# Altium schematic symbol library MCU_Microchip_ATmega.SchLib: 440 symbols (part 7 of 9) (continued)
## ATxmega16A4U-M (continued)
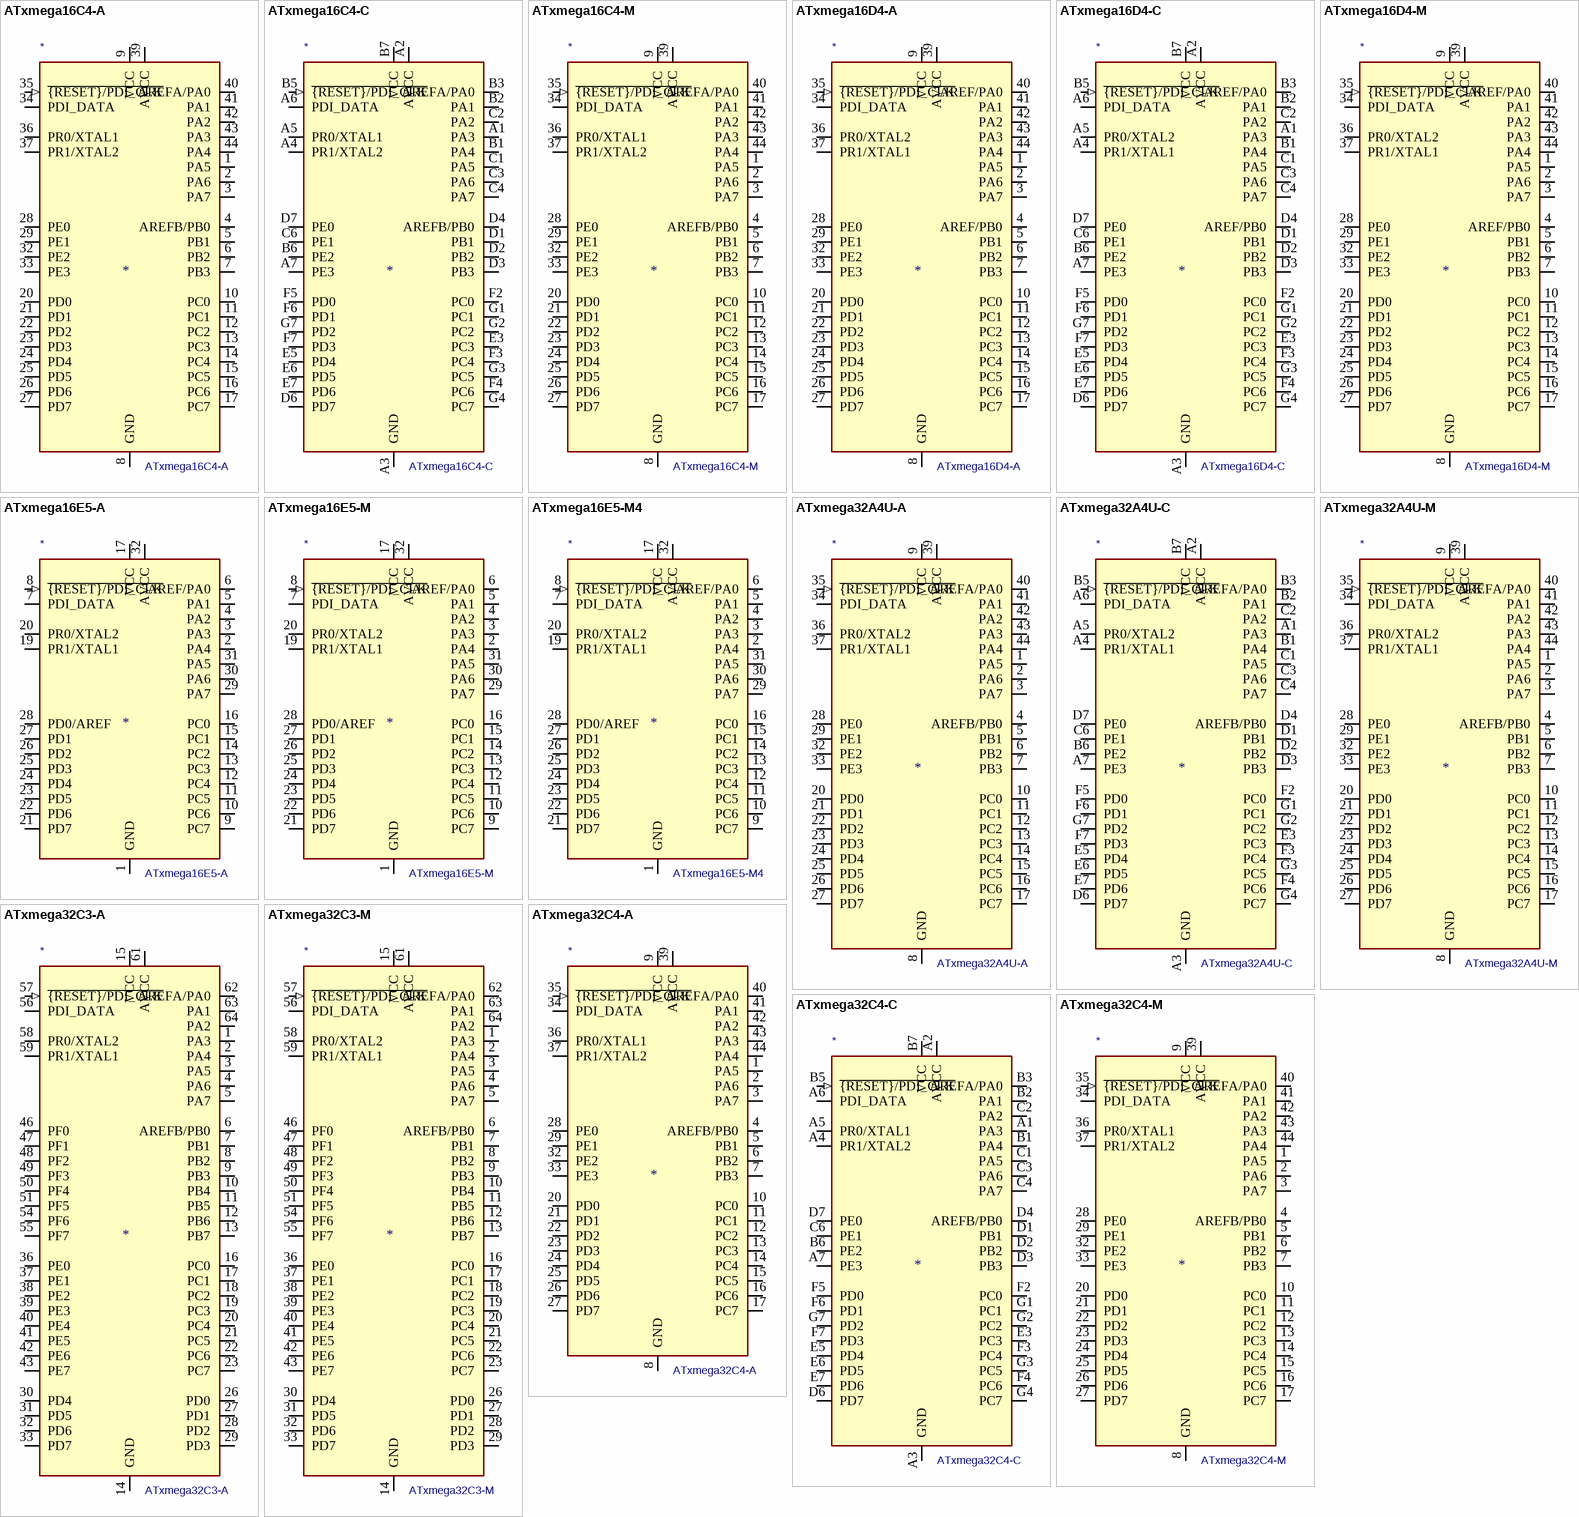
[diagram p31: symbols ATxmega16C4-A to ATxmega32C4-M]

## ATxmega16C4-A
designator *  value ATxmega16C4-A
ki_keywords: AVR 8/16bit Microcontroller XMegaAVR; ki_description: 32MHz, 16kB Flash, 4kB Boot, 2kB SRAM, 1kB EEPROM, JTAG, TQFP-44; ki_fp_filters: TQFP*10x10mm*P0.8mm*; Footprint: Package_QFP:TQFP-44_10x10mm_P0.8mm; Supplier: http://ww1.microchip.com/downloads/en/DeviceDoc/Atmel-8493-8-and-32-bit-AVR-XMEGA-Microcontrollers-ATxmega16C4-ATxmega32C4_Datasheet.pdf
footprint TQFP-44_10x10mm_P0.8mm
pins: 1 PA5 (io), 2 PA6 (io), 3 PA7 (io), 4 AREFB/PB0 (io), 5 PB1 (io), 6 PB2 (io), 7 PB3 (io), 8 GND (power), 9 VCC (power), 10 PC0 (io), 11 PC1 (io), 12 PC2 (io), 13 PC3 (io), 14 PC4 (io), 15 PC5 (io), 16 PC6 (io), 17 PC7 (io), 18 GND hidden, 19 VCC hidden, 20 PD0 (io), 21 PD1 (io), 22 PD2 (io), 23 PD3 (io), 24 PD4 (io), 25 PD5 (io), 26 PD6 (io), 27 PD7 (io), 28 PE0 (io), 29 PE1 (io), 30 GND hidden, 31 VCC hidden, 32 PE2 (io), 33 PE3 (io), 34 PDI_DATA (io), 35 ~{{RESET}/PDI_CLK} (in), 36 PR0/XTAL1 (io), 37 PR1/XTAL2 (io), 38 GND hidden, 39 AVCC (power), 40 AREFA/PA0 (io), 41 PA1 (io), 42 PA2 (io), 43 PA3 (io), 44 PA4 (io)

## ATxmega16C4-C
designator *  value ATxmega16C4-C
ki_keywords: AVR 8/16bit Microcontroller XMegaAVR; ki_description: 32MHz, 16kB Flash, 4kB Boot, 2kB SRAM, 1kB EEPROM, JTAG, VFBGA-49; ki_fp_filters: VFBGA*5.0x5.0mm*Layout7x7*P0.65mm*; Footprint: Package_BGA:VFBGA-49_5.0x5.0mm_Layout7x7_P0.65mm; Supplier: http://ww1.microchip.com/downloads/en/DeviceDoc/Atmel-8493-8-and-32-bit-AVR-XMEGA-Microcontrollers-ATxmega16C4-ATxmega32C4_Datasheet.pdf
footprint VFBGA-49_5.0x5.0mm_Layout7x7_P0.65mm
pins: A1 PA3 (io), A2 AVCC (power), A3 GND (power), A4 PR1/XTAL2 (io), A5 PR0/XTAL1 (io), A6 PDI_DATA (io), A7 PE3 (io), B1 PA4 (io), B2 PA1 (io), B3 AREFA/PA0 (io), B4 GND hidden, B5 ~{{RESET}/PDI_CLK} (in), B6 PE2 (io), B7 VCC (power), C1 PA5 (io), C2 PA2 (io), C3 PA6 (io), C4 PA7 (io), C5 GND hidden, C6 PE1 (io), C7 GND hidden, D1 PB1 (io), D2 PB2 (io), D3 PB3 (io), D4 AREFB/PB0 (io), D5 GND hidden, D6 PD7 (io), D7 PE0 (io), E1 GND hidden, E2 GND hidden, E3 PC3 (io), E4 GND hidden, E5 PD4 (io), E6 PD5 (io), E7 PD6 (io), F1 VCC hidden, F2 PC0 (io), F3 PC4 (io), F4 PC6 (io), F5 PD0 (io), F6 PD1 (io), F7 PD3 (io), G1 PC1 (io), G2 PC2 (io), G3 PC5 (io), G4 PC7 (io), G5 GND hidden, G6 VCC hidden, G7 PD2 (io)

## ATxmega16C4-M
designator *  value ATxmega16C4-M
ki_keywords: AVR 8/16bit Microcontroller XMegaAVR; ki_description: 32MHz, 16kB Flash, 4kB Boot, 2kB SRAM, 1kB EEPROM, JTAG, QFN-44; ki_fp_filters: QFN*1EP*7x7mm*P0.5mm*; Footprint: Package_DFN_QFN:QFN-44-1EP_7x7mm_P0.5mm_EP5.2x5.2mm; Supplier: http://ww1.microchip.com/downloads/en/DeviceDoc/Atmel-8493-8-and-32-bit-AVR-XMEGA-Microcontrollers-ATxmega16C4-ATxmega32C4_Datasheet.pdf
footprint QFN-44-1EP_7x7mm_P0.5mm_EP5.2x5.2mm
pins: 1 PA5 (io), 2 PA6 (io), 3 PA7 (io), 4 AREFB/PB0 (io), 5 PB1 (io), 6 PB2 (io), 7 PB3 (io), 8 GND (power), 9 VCC (power), 10 PC0 (io), 11 PC1 (io), 12 PC2 (io), 13 PC3 (io), 14 PC4 (io), 15 PC5 (io), 16 PC6 (io), 17 PC7 (io), 18 GND hidden, 19 VCC hidden, 20 PD0 (io), 21 PD1 (io), 22 PD2 (io), 23 PD3 (io), 24 PD4 (io), 25 PD5 (io), 26 PD6 (io), 27 PD7 (io), 28 PE0 (io), 29 PE1 (io), 30 GND hidden, 31 VCC hidden, 32 PE2 (io), 33 PE3 (io), 34 PDI_DATA (io), 35 ~{{RESET}/PDI_CLK} (in), 36 PR0/XTAL1 (io), 37 PR1/XTAL2 (io), 38 GND hidden, 39 AVCC (power), 40 AREFA/PA0 (io), 41 PA1 (io), 42 PA2 (io), 43 PA3 (io), 44 PA4 (io), 45 GND hidden

## ATxmega16D4-A
designator *  value ATxmega16D4-A
ki_keywords: AVR 8/16bit Microcontroller XMegaAVR; ki_description: 32MHz, 16kB Flash, 4kB Boot, 2kB SRAM, 1kB EEPROM, JTAG, TQFP-44; ki_fp_filters: TQFP*10x10mm*P0.8mm*; Footprint: Package_QFP:TQFP-44_10x10mm_P0.8mm; Supplier: http://ww1.microchip.com/downloads/en/DeviceDoc/Atmel-8135-8-and-16-bit-AVR-microcontroller-ATxmega16D4-32D4-64D4-128D4_datasheet.pdf
footprint TQFP-44_10x10mm_P0.8mm
pins: 1 PA5 (io), 2 PA6 (io), 3 PA7 (io), 4 AREF/PB0 (io), 5 PB1 (io), 6 PB2 (io), 7 PB3 (io), 8 GND (power), 9 VCC (power), 10 PC0 (io), 11 PC1 (io), 12 PC2 (io), 13 PC3 (io), 14 PC4 (io), 15 PC5 (io), 16 PC6 (io), 17 PC7 (io), 18 GND hidden, 19 VCC hidden, 20 PD0 (io), 21 PD1 (io), 22 PD2 (io), 23 PD3 (io), 24 PD4 (io), 25 PD5 (io), 26 PD6 (io), 27 PD7 (io), 28 PE0 (io), 29 PE1 (io), 30 GND hidden, 31 VCC hidden, 32 PE2 (io), 33 PE3 (io), 34 PDI_DATA (io), 35 ~{{RESET}/PDI_CLK} (in), 36 PR0/XTAL2 (io), 37 PR1/XTAL1 (io), 38 GND hidden, 39 AVCC (power), 40 AREF/PA0 (io), 41 PA1 (io), 42 PA2 (io), 43 PA3 (io), 44 PA4 (io)

## ATxmega16D4-C
designator *  value ATxmega16D4-C
ki_keywords: AVR 8/16bit Microcontroller XMegaAVR; ki_description: 32MHz, 16kB Flash, 4kB Boot, 2kB SRAM, 1kB EEPROM, JTAG, VFBGA-49; ki_fp_filters: VFBGA*5.0x5.0mm*Layout7x7*P0.65mm*; Footprint: Package_BGA:VFBGA-49_5.0x5.0mm_Layout7x7_P0.65mm; Supplier: http://ww1.microchip.com/downloads/en/DeviceDoc/Atmel-8135-8-and-16-bit-AVR-microcontroller-ATxmega16D4-32D4-64D4-128D4_datasheet.pdf
footprint VFBGA-49_5.0x5.0mm_Layout7x7_P0.65mm
pins: A1 PA3 (io), A2 AVCC (power), A3 GND (power), A4 PR1/XTAL1 (io), A5 PR0/XTAL2 (io), A6 PDI_DATA (io), A7 PE3 (io), B1 PA4 (io), B2 PA1 (io), B3 AREF/PA0 (io), B4 GND hidden, B5 ~{{RESET}/PDI_CLK} (in), B6 PE2 (io), B7 VCC (power), C1 PA5 (io), C2 PA2 (io), C3 PA6 (io), C4 PA7 (io), C5 GND hidden, C6 PE1 (io), C7 GND hidden, D1 PB1 (io), D2 PB2 (io), D3 PB3 (io), D4 AREF/PB0 (io), D5 GND hidden, D6 PD7 (io), D7 PE0 (io), E1 GND hidden, E2 GND hidden, E3 PC3 (io), E4 GND hidden, E5 PD4 (io), E6 PD5 (io), E7 PD6 (io), F1 VCC hidden, F2 PC0 (io), F3 PC4 (io), F4 PC6 (io), F5 PD0 (io), F6 PD1 (io), F7 PD3 (io), G1 PC1 (io), G2 PC2 (io), G3 PC5 (io), G4 PC7 (io), G5 GND hidden, G6 VCC hidden, G7 PD2 (io)

## ATxmega16D4-M
designator *  value ATxmega16D4-M
ki_keywords: AVR 8/16bit Microcontroller XMegaAVR; ki_description: 32MHz, 16kB Flash, 4kB Boot, 2kB SRAM, 1kB EEPROM, JTAG, QFN-44; ki_fp_filters: QFN*1EP*7x7mm*P0.5mm*; Footprint: Package_DFN_QFN:QFN-44-1EP_7x7mm_P0.5mm_EP5.2x5.2mm; Supplier: http://ww1.microchip.com/downloads/en/DeviceDoc/Atmel-8135-8-and-16-bit-AVR-microcontroller-ATxmega16D4-32D4-64D4-128D4_datasheet.pdf
footprint QFN-44-1EP_7x7mm_P0.5mm_EP5.2x5.2mm
pins: 1 PA5 (io), 2 PA6 (io), 3 PA7 (io), 4 AREF/PB0 (io), 5 PB1 (io), 6 PB2 (io), 7 PB3 (io), 8 GND (power), 9 VCC (power), 10 PC0 (io), 11 PC1 (io), 12 PC2 (io), 13 PC3 (io), 14 PC4 (io), 15 PC5 (io), 16 PC6 (io), 17 PC7 (io), 18 GND hidden, 19 VCC hidden, 20 PD0 (io), 21 PD1 (io), 22 PD2 (io), 23 PD3 (io), 24 PD4 (io), 25 PD5 (io), 26 PD6 (io), 27 PD7 (io), 28 PE0 (io), 29 PE1 (io), 30 GND hidden, 31 VCC hidden, 32 PE2 (io), 33 PE3 (io), 34 PDI_DATA (io), 35 ~{{RESET}/PDI_CLK} (in), 36 PR0/XTAL2 (io), 37 PR1/XTAL1 (io), 38 GND hidden, 39 AVCC (power), 40 AREF/PA0 (io), 41 PA1 (io), 42 PA2 (io), 43 PA3 (io), 44 PA4 (io), 45 GND hidden

## ATxmega16E5-A
designator *  value ATxmega16E5-A
ki_keywords: AVR 8/16bit Microcontroller XMegaAVR; ki_description: 32MHz, 16kB Flash, 4kB Boot, 2kB SRAM, 512B EEPROM, TQFP-32; ki_fp_filters: TQFP*7x7mm*P0.8mm*; Footprint: Package_QFP:TQFP-32_7x7mm_P0.8mm; Supplier: http://ww1.microchip.com/downloads/en/DeviceDoc/Atmel-8153-8-and-16-bit-AVR-Microcontroller-XMEGA-E-ATxmega8E5-ATxmega16E5-ATxmega32E5_Datasheet.pdf
footprint TQFP-32_7x7mm_P0.8mm
pins: 1 GND (power), 2 PA4 (io), 3 PA3 (io), 4 PA2 (io), 5 PA1 (io), 6 AREF/PA0 (io), 7 PDI_DATA (io), 8 ~{{RESET}/PDI_CLK} (in), 9 PC7 (io), 10 PC6 (io), 11 PC5 (io), 12 PC4 (io), 13 PC3 (io), 14 PC2 (io), 15 PC1 (io), 16 PC0 (io), 17 VCC (power), 18 GND hidden, 19 PR1/XTAL1 (io), 20 PR0/XTAL2 (io), 21 PD7 (io), 22 PD6 (io), 23 PD5 (io), 24 PD4 (io), 25 PD3 (io), 26 PD2 (io), 27 PD1 (io), 28 PD0/AREF (io), 29 PA7 (io), 30 PA6 (io), 31 PA5 (io), 32 AVCC (power)

## ATxmega16E5-M
designator *  value ATxmega16E5-M
ki_keywords: AVR 8/16bit Microcontroller XMegaAVR; ki_description: 32MHz, 16kB Flash, 4kB Boot, 2kB SRAM, 512B EEPROM, QFN-32; ki_fp_filters: QFN*1EP*5x5mm*P0.5mm*; Footprint: Package_DFN_QFN:QFN-32-1EP_5x5mm_P0.5mm_EP3.1x3.1mm; Supplier: http://ww1.microchip.com/downloads/en/DeviceDoc/Atmel-8153-8-and-16-bit-AVR-Microcontroller-XMEGA-E-ATxmega8E5-ATxmega16E5-ATxmega32E5_Datasheet.pdf
footprint QFN-32-1EP_5x5mm_P0.5mm_EP3.1x3.1mm
pins: 1 GND (power), 2 PA4 (io), 3 PA3 (io), 4 PA2 (io), 5 PA1 (io), 6 AREF/PA0 (io), 7 PDI_DATA (io), 8 ~{{RESET}/PDI_CLK} (in), 9 PC7 (io), 10 PC6 (io), 11 PC5 (io), 12 PC4 (io), 13 PC3 (io), 14 PC2 (io), 15 PC1 (io), 16 PC0 (io), 17 VCC (power), 18 GND hidden, 19 PR1/XTAL1 (io), 20 PR0/XTAL2 (io), 21 PD7 (io), 22 PD6 (io), 23 PD5 (io), 24 PD4 (io), 25 PD3 (io), 26 PD2 (io), 27 PD1 (io), 28 PD0/AREF (io), 29 PA7 (io), 30 PA6 (io), 31 PA5 (io), 32 AVCC (power), 33 GND hidden

## ATxmega16E5-M4
designator *  value ATxmega16E5-M4
ki_keywords: AVR 8/16bit Microcontroller XMegaAVR; ki_description: 32MHz, 16kB Flash, 4kB Boot, 2kB SRAM, 512B EEPROM, QFN-32; ki_fp_filters: QFN*1EP*4x4mm*P0.4mm*; Footprint: Package_DFN_QFN:QFN-32-1EP_4x4mm_P0.4mm_EP2.9x2.9mm; Supplier: http://ww1.microchip.com/downloads/en/DeviceDoc/Atmel-8153-8-and-16-bit-AVR-Microcontroller-XMEGA-E-ATxmega8E5-ATxmega16E5-ATxmega32E5_Datasheet.pdf
footprint QFN-32-1EP_4x4mm_P0.4mm_EP2.9x2.9mm
pins: 1 GND (power), 2 PA4 (io), 3 PA3 (io), 4 PA2 (io), 5 PA1 (io), 6 AREF/PA0 (io), 7 PDI_DATA (io), 8 ~{{RESET}/PDI_CLK} (in), 9 PC7 (io), 10 PC6 (io), 11 PC5 (io), 12 PC4 (io), 13 PC3 (io), 14 PC2 (io), 15 PC1 (io), 16 PC0 (io), 17 VCC (power), 18 GND hidden, 19 PR1/XTAL1 (io), 20 PR0/XTAL2 (io), 21 PD7 (io), 22 PD6 (io), 23 PD5 (io), 24 PD4 (io), 25 PD3 (io), 26 PD2 (io), 27 PD1 (io), 28 PD0/AREF (io), 29 PA7 (io), 30 PA6 (io), 31 PA5 (io), 32 AVCC (power), 33 GND hidden

## ATxmega32A4U-A
designator *  value ATxmega32A4U-A
ki_keywords: AVR 8/16bit Microcontroller XMegaAVR; ki_description: 32MHz, 32kB Flash, 4kB Boot, 4kB SRAM, 1kB EEPROM, JTAG, USB, TQFP-44; ki_fp_filters: TQFP*10x10mm*P0.8mm*; Footprint: Package_QFP:TQFP-44_10x10mm_P0.8mm; Supplier: http://ww1.microchip.com/downloads/en/DeviceDoc/Atmel-8387-8-and16-bit-AVR-Microcontroller-XMEGA-A4U_Datasheet.pdf
footprint TQFP-44_10x10mm_P0.8mm
pins: 1 PA5 (io), 2 PA6 (io), 3 PA7 (io), 4 AREFB/PB0 (io), 5 PB1 (io), 6 PB2 (io), 7 PB3 (io), 8 GND (power), 9 VCC (power), 10 PC0 (io), 11 PC1 (io), 12 PC2 (io), 13 PC3 (io), 14 PC4 (io), 15 PC5 (io), 16 PC6 (io), 17 PC7 (io), 18 GND hidden, 19 VCC hidden, 20 PD0 (io), 21 PD1 (io), 22 PD2 (io), 23 PD3 (io), 24 PD4 (io), 25 PD5 (io), 26 PD6 (io), 27 PD7 (io), 28 PE0 (io), 29 PE1 (io), 30 GND hidden, 31 VCC hidden, 32 PE2 (io), 33 PE3 (io), 34 PDI_DATA (io), 35 ~{{RESET}/PDI_CLK} (in), 36 PR0/XTAL2 (io), 37 PR1/XTAL1 (io), 38 GND hidden, 39 AVCC (power), 40 AREFA/PA0 (io), 41 PA1 (io), 42 PA2 (io), 43 PA3 (io), 44 PA4 (io)

## ATxmega32A4U-C
designator *  value ATxmega32A4U-C
ki_keywords: AVR 8/16bit Microcontroller XMegaAVR; ki_description: 32MHz, 32kB Flash, 4kB Boot, 4kB SRAM, 1kB EEPROM, JTAG, USB, VFBGA-49; ki_fp_filters: VFBGA*5.0x5.0mm*Layout7x7*P0.65mm*; Footprint: Package_BGA:VFBGA-49_5.0x5.0mm_Layout7x7_P0.65mm; Supplier: http://ww1.microchip.com/downloads/en/DeviceDoc/Atmel-8387-8-and16-bit-AVR-Microcontroller-XMEGA-A4U_Datasheet.pdf
footprint VFBGA-49_5.0x5.0mm_Layout7x7_P0.65mm
pins: A1 PA3 (io), A2 AVCC (power), A3 GND (power), A4 PR1/XTAL1 (io), A5 PR0/XTAL2 (io), A6 PDI_DATA (io), A7 PE3 (io), B1 PA4 (io), B2 PA1 (io), B3 AREFA/PA0 (io), B4 GND hidden, B5 ~{{RESET}/PDI_CLK} (in), B6 PE2 (io), B7 VCC (power), C1 PA5 (io), C2 PA2 (io), C3 PA6 (io), C4 PA7 (io), C5 GND hidden, C6 PE1 (io), C7 GND hidden, D1 PB1 (io), D2 PB2 (io), D3 PB3 (io), D4 AREFB/PB0 (io), D5 GND hidden, D6 PD7 (io), D7 PE0 (io), E1 GND hidden, E2 GND hidden, E3 PC3 (io), E4 GND hidden, E5 PD4 (io), E6 PD5 (io), E7 PD6 (io), F1 VCC hidden, F2 PC0 (io), F3 PC4 (io), F4 PC6 (io), F5 PD0 (io), F6 PD1 (io), F7 PD3 (io), G1 PC1 (io), G2 PC2 (io), G3 PC5 (io), G4 PC7 (io), G5 GND hidden, G6 VCC hidden, G7 PD2 (io)

## ATxmega32A4U-M
designator *  value ATxmega32A4U-M
ki_keywords: AVR 8/16bit Microcontroller XMegaAVR; ki_description: 32MHz, 32kB Flash, 4kB Boot, 4kB SRAM, 1kB EEPROM, JTAG, USB, QFN-44; ki_fp_filters: QFN*1EP*7x7mm*P0.5mm*; Footprint: Package_DFN_QFN:QFN-44-1EP_7x7mm_P0.5mm_EP5.2x5.2mm; Supplier: http://ww1.microchip.com/downloads/en/DeviceDoc/Atmel-8387-8-and16-bit-AVR-Microcontroller-XMEGA-A4U_Datasheet.pdf
footprint QFN-44-1EP_7x7mm_P0.5mm_EP5.2x5.2mm
pins: 1 PA5 (io), 2 PA6 (io), 3 PA7 (io), 4 AREFB/PB0 (io), 5 PB1 (io), 6 PB2 (io), 7 PB3 (io), 8 GND (power), 9 VCC (power), 10 PC0 (io), 11 PC1 (io), 12 PC2 (io), 13 PC3 (io), 14 PC4 (io), 15 PC5 (io), 16 PC6 (io), 17 PC7 (io), 18 GND hidden, 19 VCC hidden, 20 PD0 (io), 21 PD1 (io), 22 PD2 (io), 23 PD3 (io), 24 PD4 (io), 25 PD5 (io), 26 PD6 (io), 27 PD7 (io), 28 PE0 (io), 29 PE1 (io), 30 GND hidden, 31 VCC hidden, 32 PE2 (io), 33 PE3 (io), 34 PDI_DATA (io), 35 ~{{RESET}/PDI_CLK} (in), 36 PR0/XTAL2 (io), 37 PR1/XTAL1 (io), 38 GND hidden, 39 AVCC (power), 40 AREFA/PA0 (io), 41 PA1 (io), 42 PA2 (io), 43 PA3 (io), 44 PA4 (io), 45 GND hidden

## ATxmega32C3-A
designator *  value ATxmega32C3-A
ki_keywords: AVR 8/16bit Microcontroller XMegaAVR; ki_description: 32MHz, 32kB Flash, 4kB Boot, 4kB SRAM, 1kB EEPROM, JTAG, USB, TQFP-64; ki_fp_filters: TQFP*14x14mm*P0.8mm*; Footprint: Package_QFP:TQFP-64_14x14mm_P0.8mm; Supplier: http://ww1.microchip.com/downloads/en/DeviceDoc/Atmel-8492-8-and-16-bit-AVR-microcontroller-ATxmega32C3_64C3_128C3_192C3_256C3_datasheet.pdf
footprint TQFP-64_14x14mm_P0.8mm
pins: 1 PA3 (io), 2 PA4 (io), 3 PA5 (io), 4 PA6 (io), 5 PA7 (io), 6 AREFB/PB0 (io), 7 PB1 (io), 8 PB2 (io), 9 PB3 (io), 10 PB4 (io), 11 PB5 (io), 12 PB6 (io), 13 PB7 (io), 14 GND (power), 15 VCC (power), 16 PC0 (io), 17 PC1 (io), 18 PC2 (io), 19 PC3 (io), 20 PC4 (io), 21 PC5 (io), 22 PC6 (io), 23 PC7 (io), 24 GND hidden, 25 VCC hidden, 26 PD0 (io), 27 PD1 (io), 28 PD2 (io), 29 PD3 (io), 30 PD4 (io), 31 PD5 (io), 32 PD6 (io), 33 PD7 (io), 34 GND hidden, 35 VCC hidden, 36 PE0 (io), 37 PE1 (io), 38 PE2 (io), 39 PE3 (io), 40 PE4 (io), 41 PE5 (io), 42 PE6 (io), 43 PE7 (io), 44 GND hidden, 45 VCC hidden, 46 PF0 (io), 47 PF1 (io), 48 PF2 (io), 49 PF3 (io), 50 PF4 (io), 51 PF5 (io), 52 GND hidden, 53 VCC hidden, 54 PF6 (io), 55 PF7 (io), 56 PDI_DATA (io), 57 ~{{RESET}/PDI_CLK} (in), 58 PR0/XTAL2 (io), 59 PR1/XTAL1 (io), 60 GND hidden, 61 AVCC (power), 62 AREFA/PA0 (io), 63 PA1 (io), 64 PA2 (io)

## ATxmega32C3-M
designator *  value ATxmega32C3-M
ki_keywords: AVR 8/16bit Microcontroller XMegaAVR; ki_description: 32MHz, 32kB Flash, 4kB Boot, 4kB SRAM, 1kB EEPROM, JTAG, USB, QFN-64; ki_fp_filters: QFN*1EP*9x9mm*P0.5mm*; Footprint: Package_DFN_QFN:QFN-64-1EP_9x9mm_P0.5mm_EP7.65x7.65mm; Supplier: http://ww1.microchip.com/downloads/en/DeviceDoc/Atmel-8492-8-and-16-bit-AVR-microcontroller-ATxmega32C3_64C3_128C3_192C3_256C3_datasheet.pdf
footprint QFN-64-1EP_9x9mm_P0.5mm_EP7.65x7.65mm
pins: 1 PA3 (io), 2 PA4 (io), 3 PA5 (io), 4 PA6 (io), 5 PA7 (io), 6 AREFB/PB0 (io), 7 PB1 (io), 8 PB2 (io), 9 PB3 (io), 10 PB4 (io), 11 PB5 (io), 12 PB6 (io), 13 PB7 (io), 14 GND (power), 15 VCC (power), 16 PC0 (io), 17 PC1 (io), 18 PC2 (io), 19 PC3 (io), 20 PC4 (io), 21 PC5 (io), 22 PC6 (io), 23 PC7 (io), 24 GND hidden, 25 VCC hidden, 26 PD0 (io), 27 PD1 (io), 28 PD2 (io), 29 PD3 (io), 30 PD4 (io), 31 PD5 (io), 32 PD6 (io), 33 PD7 (io), 34 GND hidden, 35 VCC hidden, 36 PE0 (io), 37 PE1 (io), 38 PE2 (io), 39 PE3 (io), 40 PE4 (io), 41 PE5 (io), 42 PE6 (io), 43 PE7 (io), 44 GND hidden, 45 VCC hidden, 46 PF0 (io), 47 PF1 (io), 48 PF2 (io), 49 PF3 (io), 50 PF4 (io), 51 PF5 (io), 52 GND hidden, 53 VCC hidden, 54 PF6 (io), 55 PF7 (io), 56 PDI_DATA (io), 57 ~{{RESET}/PDI_CLK} (in), 58 PR0/XTAL2 (io), 59 PR1/XTAL1 (io), 60 GND hidden, 61 AVCC (power), 62 AREFA/PA0 (io), 63 PA1 (io), 64 PA2 (io), 65 GND hidden

## ATxmega32C4-A
designator *  value ATxmega32C4-A
ki_keywords: AVR 8/16bit Microcontroller XMegaAVR; ki_description: 32MHz, 32kB Flash, 4kB Boot, 4kB SRAM, 1kB EEPROM, JTAG, TQFP-44; ki_fp_filters: TQFP*10x10mm*P0.8mm*; Footprint: Package_QFP:TQFP-44_10x10mm_P0.8mm; Supplier: http://ww1.microchip.com/downloads/en/DeviceDoc/Atmel-8493-8-and-32-bit-AVR-XMEGA-Microcontrollers-ATxmega16C4-ATxmega32C4_Datasheet.pdf
footprint TQFP-44_10x10mm_P0.8mm
pins: 1 PA5 (io), 2 PA6 (io), 3 PA7 (io), 4 AREFB/PB0 (io), 5 PB1 (io), 6 PB2 (io), 7 PB3 (io), 8 GND (power), 9 VCC (power), 10 PC0 (io), 11 PC1 (io), 12 PC2 (io), 13 PC3 (io), 14 PC4 (io), 15 PC5 (io), 16 PC6 (io), 17 PC7 (io), 18 GND hidden, 19 VCC hidden, 20 PD0 (io), 21 PD1 (io), 22 PD2 (io), 23 PD3 (io), 24 PD4 (io), 25 PD5 (io), 26 PD6 (io), 27 PD7 (io), 28 PE0 (io), 29 PE1 (io), 30 GND hidden, 31 VCC hidden, 32 PE2 (io), 33 PE3 (io), 34 PDI_DATA (io), 35 ~{{RESET}/PDI_CLK} (in), 36 PR0/XTAL1 (io), 37 PR1/XTAL2 (io), 38 GND hidden, 39 AVCC (power), 40 AREFA/PA0 (io), 41 PA1 (io), 42 PA2 (io), 43 PA3 (io), 44 PA4 (io)

## ATxmega32C4-C
designator *  value ATxmega32C4-C
ki_keywords: AVR 8/16bit Microcontroller XMegaAVR; ki_description: 32MHz, 32kB Flash, 4kB Boot, 4kB SRAM, 1kB EEPROM, JTAG, VFBGA-49; ki_fp_filters: VFBGA*5.0x5.0mm*Layout7x7*P0.65mm*; Footprint: Package_BGA:VFBGA-49_5.0x5.0mm_Layout7x7_P0.65mm; Supplier: http://ww1.microchip.com/downloads/en/DeviceDoc/Atmel-8493-8-and-32-bit-AVR-XMEGA-Microcontrollers-ATxmega16C4-ATxmega32C4_Datasheet.pdf
footprint VFBGA-49_5.0x5.0mm_Layout7x7_P0.65mm
pins: A1 PA3 (io), A2 AVCC (power), A3 GND (power), A4 PR1/XTAL2 (io), A5 PR0/XTAL1 (io), A6 PDI_DATA (io), A7 PE3 (io), B1 PA4 (io), B2 PA1 (io), B3 AREFA/PA0 (io), B4 GND hidden, B5 ~{{RESET}/PDI_CLK} (in), B6 PE2 (io), B7 VCC (power), C1 PA5 (io), C2 PA2 (io), C3 PA6 (io), C4 PA7 (io), C5 GND hidden, C6 PE1 (io), C7 GND hidden, D1 PB1 (io), D2 PB2 (io), D3 PB3 (io), D4 AREFB/PB0 (io), D5 GND hidden, D6 PD7 (io), D7 PE0 (io), E1 GND hidden, E2 GND hidden, E3 PC3 (io), E4 GND hidden, E5 PD4 (io), E6 PD5 (io), E7 PD6 (io), F1 VCC hidden, F2 PC0 (io), F3 PC4 (io), F4 PC6 (io), F5 PD0 (io), F6 PD1 (io), F7 PD3 (io), G1 PC1 (io), G2 PC2 (io), G3 PC5 (io), G4 PC7 (io), G5 GND hidden, G6 VCC hidden, G7 PD2 (io)